# Altium footprint library SWLIB(150721).PcbLib: 348 footprints (part 10 of 22)
Each footprint in its own frame and in the unit in brackets; x right, y up, seen from the top. Pads: shape width x height; smd on the part's side, far side on the other; paste and mask are expansions set on the pad; w line width, h text height; cw(c..) or ccw(c..) is an arc to the next point about the centre after c.
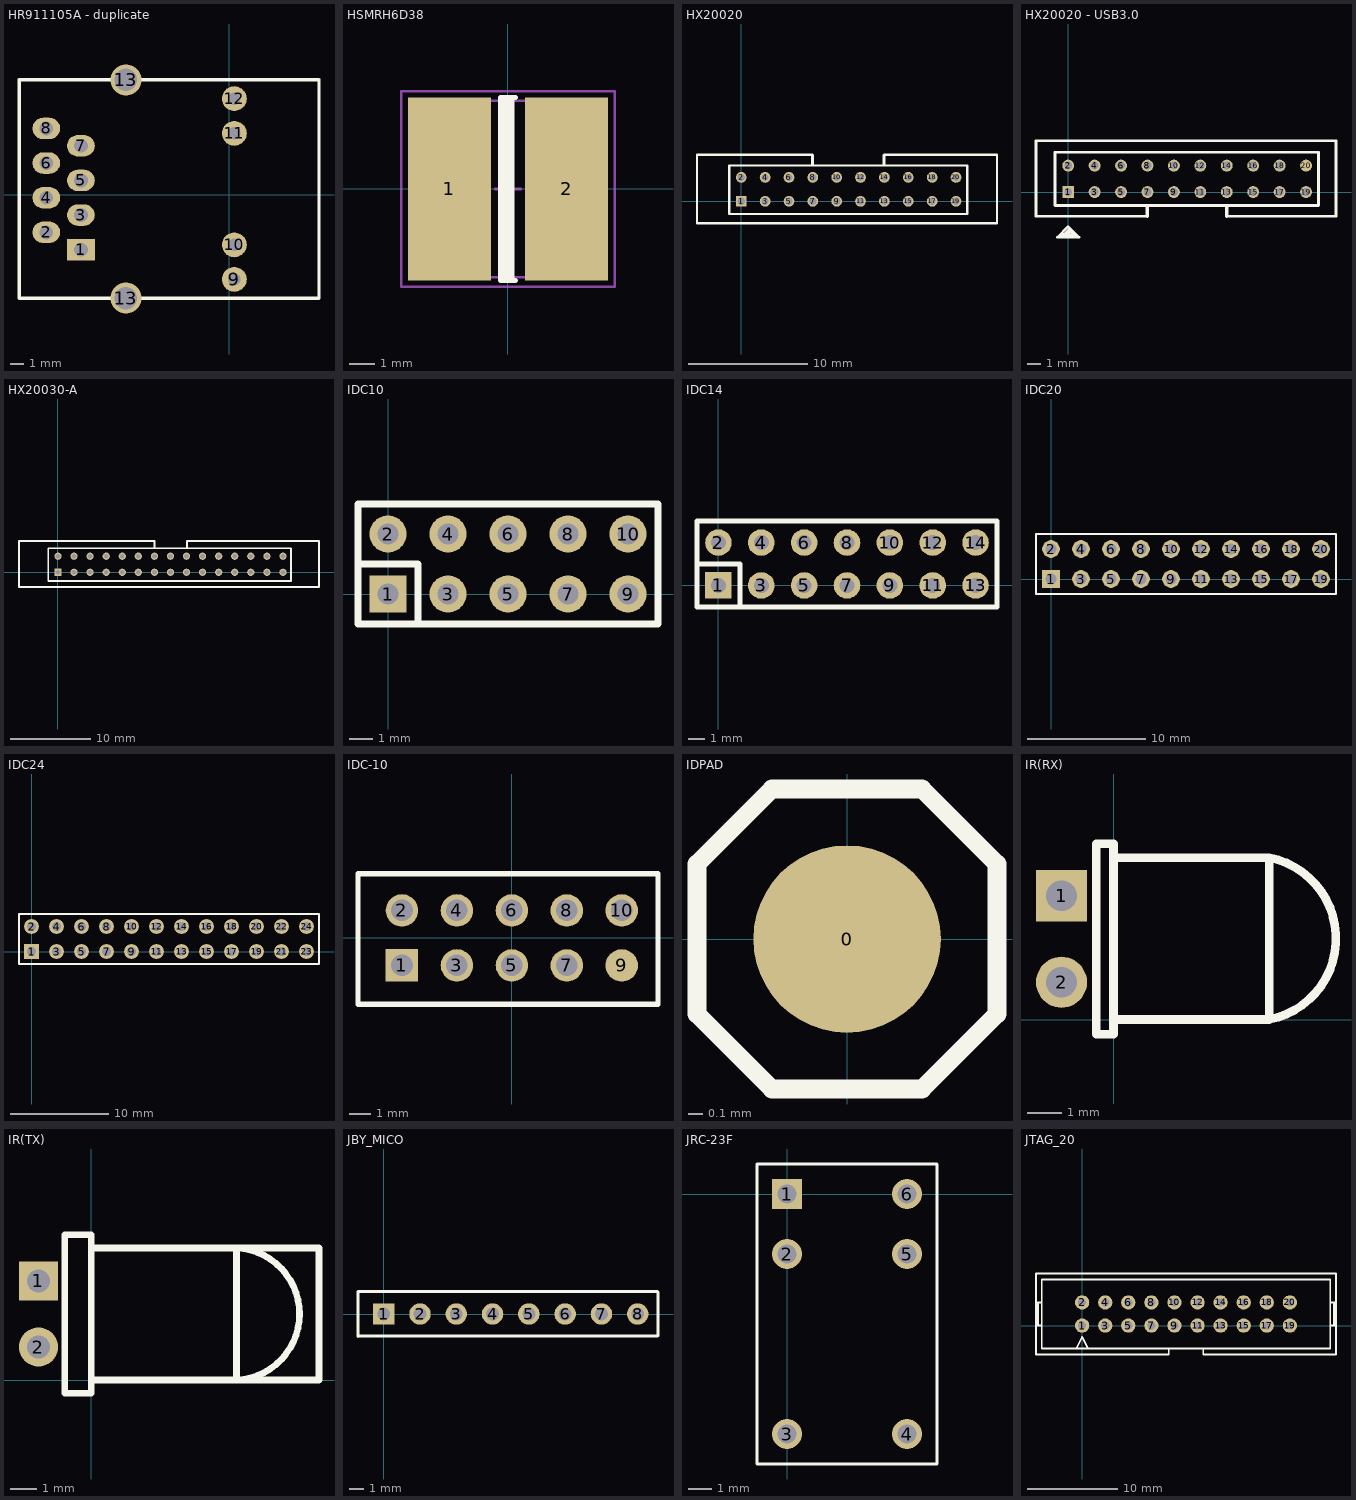
[diagram p9: the footprints below, top view; thin cyan lines are the x and y axes]

## HR911105A - duplicate [mil] "HR911105A"
pads (14):
  rect 80x62 hole 40: 1(-429,-159)
  oval 80x62 hole 40: 2(-529,-109) 3(-429,-59) 4(-529,-9) 5(-429,41) 6(-529,91) 7(-429,141) 8(-529,191)
  round 72 hole 36: 9(13.91,-244.63) 10(13.91,-145) 11(13.91,176.87) 12(13.91,277)
  round 90 hole 65: 13(-299.08,-298.76) 13(-299.08,331.16)
Top Overlay:
  lines w10: -607.74,-299 -607.5,-298.76 ; -607.74,331 -607.58,331.16 ; -607.58,331.16 -607.58,-298.69 -607.5,-298.76 ; -607.58,331.16 -299.08,331.16 258.24,331.16 258.4,331 258.4,-299 258.17,-298.76 -299.08,-298.76 -607.5,-298.76
Multi-Layer:
  circle w5: c-169,241 r70.8
  circle w5: c-169,-209 r70.8

## HSMRH6D38 [mm] "MELF Diode, 2-Leads, Body 7.0x7.0mm, IPC Medium Density"
height 7
pads (2):
  rect 3.3x7.25 smd: 1(-2.325,0) 2(2.325,0)
Top Overlay:
  rectangle: -0.3,-3.625 0.25,3.625
  lines w0.2: 0.3,-3.625 -0.3,-3.625 -0.3,3.625 0.3,3.625
Mechanical 13:
  rectangle: -3.5,-3.5 -2.558,3.5
  lines w0.1: -3.5,-3.5 -3.5,3.5 3.5,3.5 3.5,-3.5 -3.5,-3.5
Mechanical 15:
  lines w0.1: -0.5,0 0.5,0 ; 0,-0.5 0,0.5 ; -4.225,-3.875 -4.225,3.875 4.225,3.875 4.225,-3.875 -4.225,-3.875
3D body: height 7, standoff 0, extent -3.5,-3.5 3.5,3.5

## HX20020 [mm]
pads (20):
  rect 0.9x0.9 hole 0.6: 1(0,0)
  round 0.9 hole 0.6: 2(0,2) 3(2,0) 4(2,2) 5(4,0) 6(4,2) 7(6,0) 8(6,2) 9(8,0) 10(8,2) 11(10,0) 12(10,2) 13(12,0) 14(12,2) 15(14,0) 16(14,2) 17(16,0) 18(16,2) 19(18,0) 20(18,2)
Top Overlay:
  lines w0.2: -1,0.5 -1,2.997 18.948,2.997 18.948,-1.067 -1,-1.067 -1,1.5 ; 5.969,3.886 -3.708,3.886 -3.708,-1.829 21.438,-1.829 21.438,3.886 11.963,3.886
  lines w0.254: 5.969,3.073 5.969,3.886 ; 11.963,3.124 11.963,3.886
3D body "1001-1.STEP": height 8.54, standoff -3, extent 16.73,-1.27 19.27,1.27
3D body "1001-1.STEP": height 8.54, standoff -3, extent 10.73,-1.27 13.27,1.27
3D body "1001-1.STEP": height 8.54, standoff -3, extent 12.73,-1.27 15.27,1.27
3D body "1001-1.STEP": height 8.54, standoff -3, extent 14.73,-1.27 17.27,1.27
3D body "1001-1.STEP": height 8.54, standoff -3, extent 4.73,-1.27 7.27,1.27
3D body "1001-1.STEP": height 8.54, standoff -3, extent 6.73,-1.27 9.27,1.27
3D body "1001-1.STEP": height 8.54, standoff -3, extent 8.73,-1.27 11.27,1.27
3D body "1001-1.STEP": height 8.54, standoff -3, extent -1.27,-1.27 1.27,1.27
3D body "1001-1.STEP": height 8.54, standoff -3, extent 0.73,-1.27 3.27,1.27
3D body "1001-1.STEP": height 8.54, standoff -3, extent 2.73,-1.27 5.27,1.27
3D body "1001-1.STEP": height 8.54, standoff -3, extent 16.73,0.73 19.27,3.27
3D body "1001-1.STEP": height 8.54, standoff -3, extent 10.73,0.73 13.27,3.27
3D body "1001-1.STEP": height 8.54, standoff -3, extent 12.73,0.73 15.27,3.27
3D body "1001-1.STEP": height 8.54, standoff -3, extent 14.73,0.73 17.27,3.27
3D body "1001-1.STEP": height 8.54, standoff -3, extent 4.73,0.73 7.27,3.27
3D body "1001-1.STEP": height 8.54, standoff -3, extent 6.73,0.73 9.27,3.27
3D body "1001-1.STEP": height 8.54, standoff -3, extent 8.73,0.73 11.27,3.27
3D body "1001-1.STEP": height 8.54, standoff -3, extent 2.73,0.73 5.27,3.27
3D body "1001-1.STEP": height 8.54, standoff -3, extent 0.73,0.73 3.27,3.27
3D body "1001-1.STEP": height 8.54, standoff -3, extent -1.27,0.73 1.27,3.27

## HX20020 - USB3.0 [mm]
pads (20):
  rect 0.9x0.9 hole 0.6: 1(0,0)
  round 0.9 hole 0.6: 2(0,2) 3(2,0) 4(2,2) 5(4,0) 6(4,2) 7(6,0) 8(6,2) 9(8,0) 10(8,2) 11(10,0) 12(10,2) 13(12,0) 14(12,2) 15(14,0) 16(14,2) 17(16,0) 18(16,2) 19(18,0)
  round 0.9 smd: 20(18,2)
Top Overlay:
  lines w0.2: -1,0.5 -1,2.997 18.948,2.997 18.948,-1.016 -1,-1.016 -1,1.5 ; -0.508,-3.429 -0.508,-3.404 0.102,-2.794 ; -0.229,-3.404 0.229,-2.946 ; 0.076,-3.404 0.076,-3.378 0.356,-3.099 ; 0.305,-3.429 0.279,-3.404 0.279,-3.175 0.508,-3.404 ; 5.994,-1.829 -2.438,-1.829 -2.438,3.886 11.963,3.886 20.269,3.886 20.269,-1.829 12.014,-1.829 ; -0.813,-3.429 0.813,-3.429 0,-2.616 -0.813,-3.429
  lines w0.254: 5.994,-1.829 5.994,-1.016 ; 11.989,-1.829 11.989,-1.041
3D body "1001-1.STEP": height 8.54, standoff -3, extent 16.73,-1.27 19.27,1.27
3D body "1001-1.STEP": height 8.54, standoff -3, extent 10.73,-1.27 13.27,1.27
3D body "1001-1.STEP": height 8.54, standoff -3, extent 12.73,-1.27 15.27,1.27
3D body "1001-1.STEP": height 8.54, standoff -3, extent 14.73,-1.27 17.27,1.27
3D body "1001-1.STEP": height 8.54, standoff -3, extent 4.73,-1.27 7.27,1.27
3D body "1001-1.STEP": height 8.54, standoff -3, extent 6.73,-1.27 9.27,1.27
3D body "1001-1.STEP": height 8.54, standoff -3, extent 8.73,-1.27 11.27,1.27
3D body "1001-1.STEP": height 8.54, standoff -3, extent -1.27,-1.27 1.27,1.27
3D body "1001-1.STEP": height 8.54, standoff -3, extent 0.73,-1.27 3.27,1.27
3D body "1001-1.STEP": height 8.54, standoff -3, extent 2.73,-1.27 5.27,1.27
3D body "1001-1.STEP": height 8.54, standoff -3, extent 16.73,0.73 19.27,3.27
3D body "1001-1.STEP": height 8.54, standoff -3, extent 10.73,0.73 13.27,3.27
3D body "1001-1.STEP": height 8.54, standoff -3, extent 12.73,0.73 15.27,3.27
3D body "1001-1.STEP": height 8.54, standoff -3, extent 14.73,0.73 17.27,3.27
3D body "1001-1.STEP": height 8.54, standoff -3, extent 4.73,0.73 7.27,3.27
3D body "1001-1.STEP": height 8.54, standoff -3, extent 6.73,0.73 9.27,3.27
3D body "1001-1.STEP": height 8.54, standoff -3, extent 8.73,0.73 11.27,3.27
3D body "1001-1.STEP": height 8.54, standoff -3, extent 2.73,0.73 5.27,3.27
3D body "1001-1.STEP": height 8.54, standoff -3, extent 0.73,0.73 3.27,3.27
3D body "1001-1.STEP": height 8.54, standoff -3, extent -1.27,0.73 1.27,3.27

## HX20030-A [mm]
pads (30):
  rect 0.9x0.9 hole 0.6: 1(0,0)
  round 0.9 hole 0.6: 2(0,2) 3(2,0) 4(2,2) 5(4,0) 6(4,2) 7(6,0) 8(6,2) 9(8,0) 10(8,2) 11(10,0) 12(10,2) 13(12,0) 14(12,2) 15(14,0) 16(14,2) 17(16,0) 18(16,2) 19(18,0) 20(18,2) 21(20,0) 22(20,2) 23(22,0) 24(22,2) 25(24,0) 26(24,2) 27(26,0) 28(26,2) 29(28,0) 30(28,2)
Top Overlay:
  lines w0.2: -4.851,3.861 -4.851,-1.829 32.487,-1.829 32.487,3.886 16.078,3.886 ; -4.851,3.886 12.04,3.886 ; -1.219,0.5 -1.219,2.997 29,2.997 29,-1.092 -1.219,-1.092 -1.219,1.5
  lines w0.254: 12.04,3.073 12.04,3.886 ; 16.078,3.124 16.078,3.886
3D body: height 2, standoff 0, extent -0.965,-0.762 29.007,3.912
3D body: height 6, standoff 0, extent -4.851,-1.778 32.487,3.912
3D body "1001-1.STEP": height 8.54, standoff -3, extent -1.27,0.73 1.27,3.27
3D body "1001-1.STEP": height 8.54, standoff -3, extent 0.73,0.73 3.27,3.27
3D body "1001-1.STEP": height 8.54, standoff -3, extent 2.73,0.73 5.27,3.27
3D body "1001-1.STEP": height 8.54, standoff -3, extent 8.73,0.73 11.27,3.27
3D body "1001-1.STEP": height 8.54, standoff -3, extent 6.73,0.73 9.27,3.27
3D body "1001-1.STEP": height 8.54, standoff -3, extent 4.73,0.73 7.27,3.27
3D body "1001-1.STEP": height 8.54, standoff -3, extent 14.73,0.73 17.27,3.27
3D body "1001-1.STEP": height 8.54, standoff -3, extent 12.73,0.73 15.27,3.27
3D body "1001-1.STEP": height 8.54, standoff -3, extent 10.73,0.73 13.27,3.27
3D body "1001-1.STEP": height 8.54, standoff -3, extent 20.73,0.73 23.27,3.27
3D body "1001-1.STEP": height 8.54, standoff -3, extent 18.73,0.73 21.27,3.27
3D body "1001-1.STEP": height 8.54, standoff -3, extent 16.73,0.73 19.27,3.27
3D body "1001-1.STEP": height 8.54, standoff -3, extent 26.73,0.73 29.27,3.27
3D body "1001-1.STEP": height 8.54, standoff -3, extent 24.73,0.73 27.27,3.27
3D body "1001-1.STEP": height 8.54, standoff -3, extent 22.73,0.73 25.27,3.27
3D body "1001-1.STEP": height 8.54, standoff -3, extent 2.73,-1.27 5.27,1.27
3D body "1001-1.STEP": height 8.54, standoff -3, extent 0.73,-1.27 3.27,1.27
3D body "1001-1.STEP": height 8.54, standoff -3, extent -1.27,-1.27 1.27,1.27
3D body "1001-1.STEP": height 8.54, standoff -3, extent 8.73,-1.27 11.27,1.27
3D body "1001-1.STEP": height 8.54, standoff -3, extent 6.73,-1.27 9.27,1.27
3D body "1001-1.STEP": height 8.54, standoff -3, extent 4.73,-1.27 7.27,1.27
3D body "1001-1.STEP": height 8.54, standoff -3, extent 14.73,-1.27 17.27,1.27
3D body "1001-1.STEP": height 8.54, standoff -3, extent 12.73,-1.27 15.27,1.27
3D body "1001-1.STEP": height 8.54, standoff -3, extent 10.73,-1.27 13.27,1.27
3D body "1001-1.STEP": height 8.54, standoff -3, extent 20.73,-1.27 23.27,1.27
3D body "1001-1.STEP": height 8.54, standoff -3, extent 18.73,-1.27 21.27,1.27
3D body "1001-1.STEP": height 8.54, standoff -3, extent 16.73,-1.27 19.27,1.27
3D body "1001-1.STEP": height 8.54, standoff -3, extent 26.73,-1.27 29.27,1.27
3D body "1001-1.STEP": height 8.54, standoff -3, extent 24.73,-1.27 27.27,1.27
3D body "1001-1.STEP": height 8.54, standoff -3, extent 22.73,-1.27 25.27,1.27

## IDC10 [mil]
pads (10):
  rect 62x62 hole 35: 1(0,0)
  round 62 hole 35: 2(0,100) 3(100,0) 4(100,100) 5(200,0) 6(200,100) 7(300,0) 8(300,100) 9(400,0) 10(400,100)
Top Overlay:
  lines w12: -50,50 50,50 50,-50 ; -50,-50 450,-50 450,150 -50,150 -50,-50

## IDC14 [mil]
pads (14):
  rect 62x62 hole 35: 1(0,0)
  round 62 hole 35: 2(0,100) 3(100,0) 4(100,100) 5(200,0) 6(200,100) 7(300,0) 8(300,100) 9(400,0) 10(400,100) 11(500,0) 12(500,100) 13(600,0) 14(600,100)
Top Overlay:
  lines w12: -50,50 50,50 50,-50 ; -50,-50 650,-50 650,150 -50,150 -50,-50

## IDC20 [mm]
pads (20):
  rect 1.5x1.5 hole 0.9: 1(0,0)
  round 1.5 hole 0.9: 2(0,2.54) 3(2.54,0) 4(2.54,2.54) 5(5.08,0) 6(5.08,2.54) 7(7.62,0) 8(7.62,2.54) 9(10.16,0) 10(10.16,2.54) 11(12.7,0) 12(12.7,2.54) 13(15.24,0) 14(15.24,2.54) 15(17.78,0) 16(17.78,2.54) 17(20.32,0) 18(20.32,2.54) 19(22.86,0) 20(22.86,2.54)
Top Overlay:
  lines w0.2: -1.27,-1.27 -1.27,3.81 0.635,3.81 24.13,3.81 24.13,-1.27 0.635,-1.27 -1.27,-1.27

## IDC24 [mm]
pads (24):
  rect 1.5x1.5 hole 0.9: 1(0,0)
  round 1.5 hole 0.9: 2(0,2.54) 3(2.54,0) 4(2.54,2.54) 5(5.08,0) 6(5.08,2.54) 7(7.62,0) 8(7.62,2.54) 9(10.16,0) 10(10.16,2.54) 11(12.7,0) 12(12.7,2.54) 13(15.24,0) 14(15.24,2.54) 15(17.78,0) 16(17.78,2.54) 17(20.32,0) 18(20.32,2.54) 19(22.86,0) 20(22.86,2.54) 21(25.4,0) 22(25.4,2.54) 23(27.94,0) 24(27.94,2.54)
Top Overlay:
  lines w0.2: -1.27,-1.27 -1.27,3.81 29.21,3.81 29.21,-1.27 -1.27,-1.27

## IDC-10 [mm]
pads (10):
  rect 1.499x1.499 hole 1: 1(-5.08,-1.27)
  round 1.5 hole 1: 2(-5.08,1.27) 3(-2.54,-1.27) 4(-2.54,1.27) 5(0,-1.27) 6(0,1.27) 7(2.54,-1.27) 8(2.54,1.27) 10(5.08,1.27)
  round 1.5 smd: 9(5.08,-1.27)
Top Overlay:
  lines w0.254: -7.112,-3.073 6.756,-3.073 6.756,2.972 -7.112,2.972 -7.112,-3.073
3D body "1001-5.STEP": height 8.54, standoff -3, extent -6.248,-0.254 6.452,2.286
3D body "1001-4.STEP": height 8.54, standoff -3, extent -6.248,-2.591 3.912,-0.051

## IDPAD [mm]
pads (1):
  round 1.27 smd: 0(0,0)
Top Overlay:
  lines w0.127: -1.016,-0.508 -1.016,0.508 -0.508,1.016 0.508,1.016 1.016,0.508 1.016,-0.508 0.508,-1.016 -0.508,-1.016 -1.016,-0.508

## IR(RX) [mm] "电脑鼠红外"
pads (2):
  rect 1.5x1.5 hole 0.9: 1(-1.524,3.632)
  round 1.5 hole 0.9: 2(-1.524,1.092)
Top Overlay:
  lines w0.254: 0,0 4.572,0 ; 0,0 0,4.75 ; 0,0 0,-0.432 -0.508,-0.432 -0.508,5.156 0,5.156 0,4.75 ; 0,4.75 4.572,4.75 ; 4.572,0 ccw(c4.108,2.375) 4.572,4.75 ; 4.572,0 4.572,4.75

## IR(TX) [mm] "电脑鼠红外"
pads (2):
  rect 1.5x1.5 hole 0.9: 1(-2.032,3.81)
  round 1.5 hole 0.9: 2(-2.032,1.27)
Top Overlay:
  lines w0.254: 0,0 0,-0.508 -1.016,-0.508 -1.016,5.588 0,5.588 0,5.08 ; 0,0 8.763,0 8.763,5.08 0,5.08 ; 0,0 0,5.08 ; 5.588,0 ccw(c5.471,2.54) 5.588,5.08 5.588,0

## JBY_MICO [mm]
pads (8):
  rect 1.5x1.5 hole 0.9: 1(0,0)
  round 1.5 hole 0.9: 2(2.54,0) 3(5.08,0) 4(7.62,0) 5(10.16,0) 6(12.7,0) 7(15.24,0) 8(17.78,0)
Top Overlay:
  lines w0.2: -1.803,-1.575 -1.803,1.575 19.177,1.575 19.202,1.549 19.202,-1.524 19.177,-1.549 -1.778,-1.549 -1.803,-1.575

## JRC-23F [mm]
pads (6):
  rect 1.27x1.27 hole 0.8: 1(0,0)
  round 1.27 hole 0.8: 2(0,-2.54) 3(0,-10.16) 4(5.08,-10.16) 5(5.08,-2.54) 6(5.08,0)
Top Overlay:
  lines w0.127: -1.27,-11.43 6.35,-11.43 6.35,1.27 -1.27,1.27 -1.27,-11.43

## JTAG_20 [mil]
pads (20):
  round 62 hole 35: 1(0,0) 2(0,100) 3(100,0) 4(100,100) 5(200,0) 6(200,100) 7(300,0) 8(300,100) 9(400,0) 10(400,100) 11(500,0) 12(500,100) 13(600,0) 14(600,100) 15(700,0) 16(700,100) 17(800,0) 18(800,100) 19(900,0) 20(900,100)
Top Overlay:
  lines w8: -200,0 -175,0 ; -200,100 -175,100 ; -191.67,0 -191.67,100 ; -25,-100 0,-50 25,-100 ; 110.43,-125 375,-125 375,-100 ; 125,-125 -200,-125 -200,225 1100,225 1100,-125 775,-125 525,-125 525,-100 ; 1075,0 1100,0 ; 1075,100 1100,100 ; 1091.67,0 1091.67,100 ; 375,-100 -175,-100 -175,200 1075,200 1075,-100 525,-100 ; 375,-100 525,-100
3D body: height 275.59, standoff 0, extent -204,-127 1100,227
3D body: height 118.11, standoff 0, extent -176,-127 1076,202
3D body "1001-5.STEP": height 336.22, standoff -118.11, extent -50,-50 450,50
3D body "1001-5.STEP": height 336.22, standoff -118.11, extent 450,-50 950,50
3D body "1001-5.STEP": height 336.22, standoff -118.11, extent -50,50 450,150
3D body "1001-5.STEP": height 336.22, standoff -118.11, extent 450,50 950,150